# Altium footprint library ADP_Connector.PcbLib: 49 footprints (part 2 of 4)
Each footprint in its own frame and in the unit in brackets; x right, y up, seen from the top. Pads: shape width x height; smd on the part's side, far side on the other; paste and mask are expansions set on the pad; w line width, h text height; cw(c..) or ccw(c..) is an arc to the next point about the centre after c.
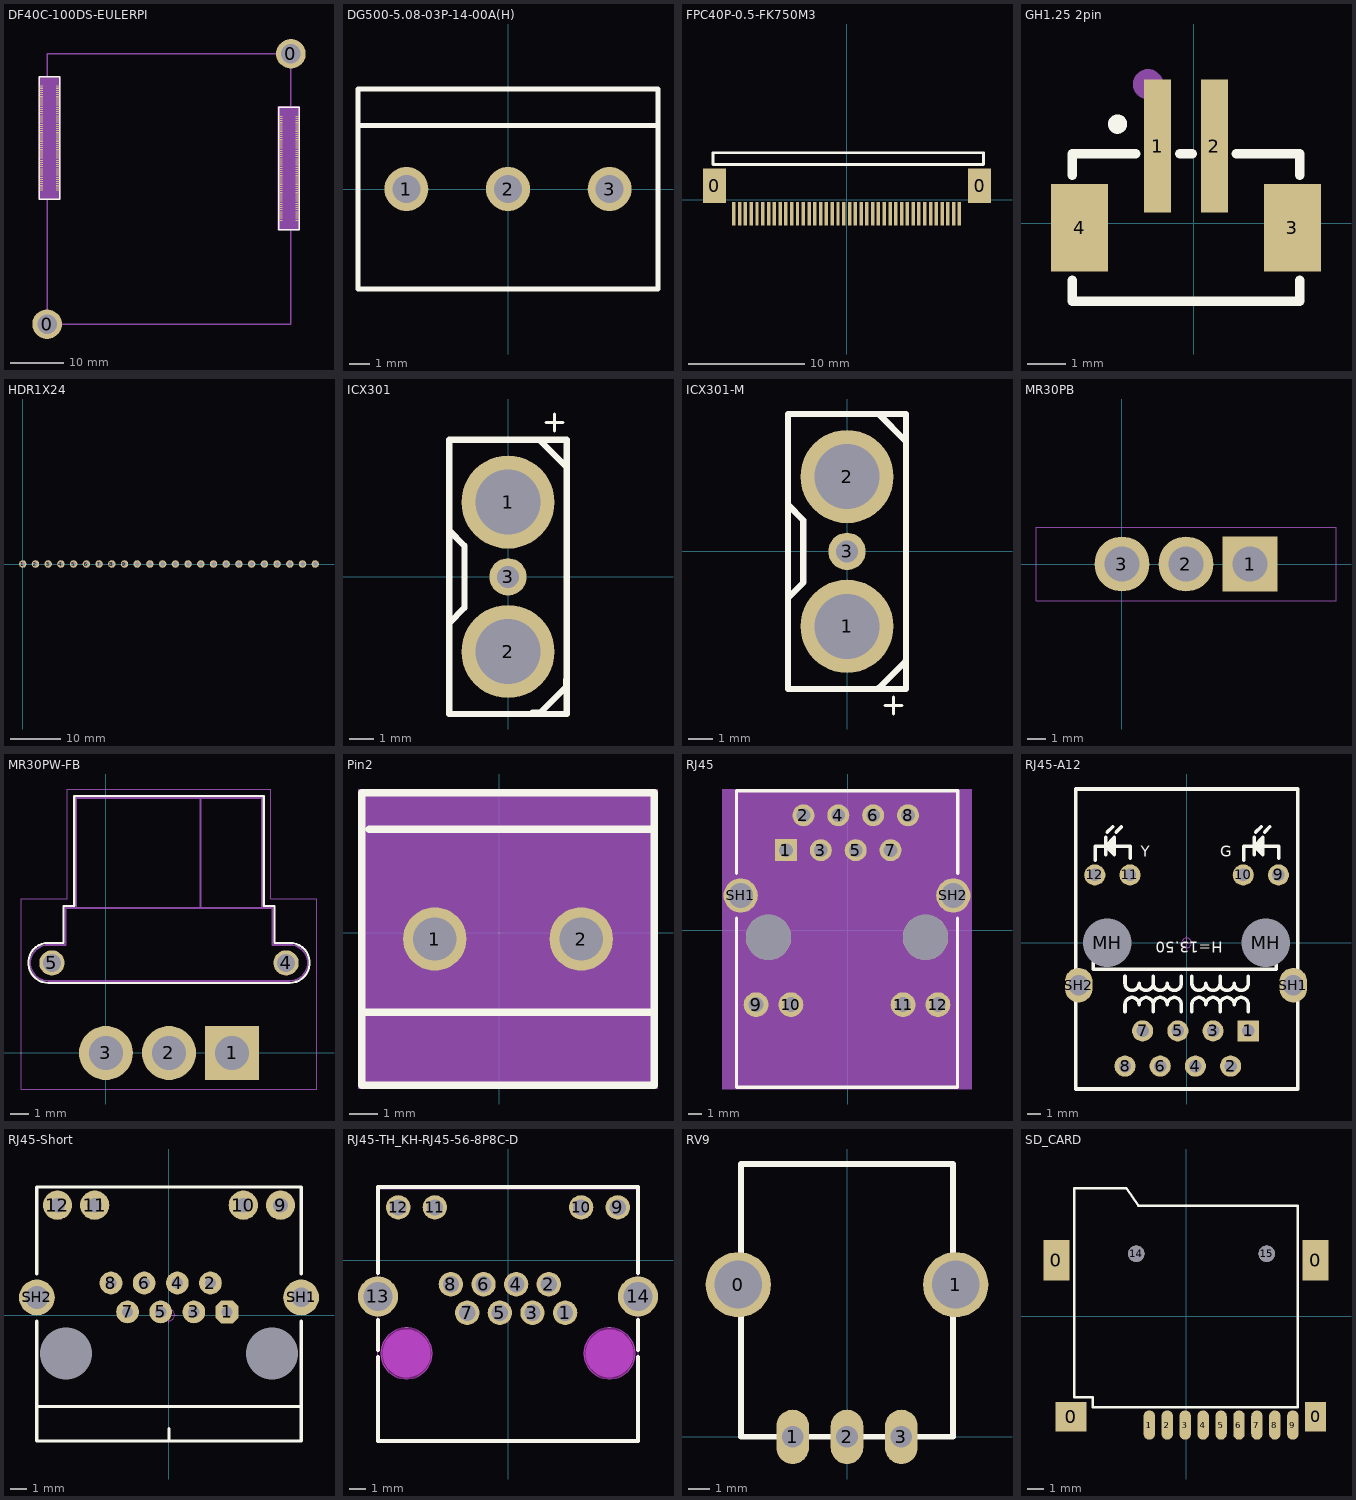
[diagram p1: the footprints below, top view; thin cyan lines are the x and y axes]

## DF40C-100DS-EULERPI [mil] "欧拉派核心板引脚"
pads (202):
  round 220.5 / inner round 220.5 / far side round 149.6 hole 145.7: 0(557.61,247.13) 0(2368.63,2255)
  rect 27.56x7.87 smd: A1(514.59,1243.57) A1R(2293.51,1018.57) A2(514.59,1259.32) A2R(2293.51,1034.32) A3(514.59,1275.07) A3R(2293.51,1050.07) A4(514.59,1290.82) A4R(2293.51,1065.82) A5(514.59,1306.57) A5R(2293.51,1081.57) A6(514.59,1322.31) A6R(2293.51,1097.31) A7(514.59,1338.06) A7R(2293.51,1113.06) A8(514.59,1353.81) A8R(2293.51,1128.81) A9(514.59,1369.56) A9R(2293.51,1144.56) A10(514.59,1385.31) A10R(2293.51,1160.31) A11(514.59,1401.05) A11R(2293.51,1176.05) A12(514.59,1416.8) A12R(2293.51,1191.8) A13(514.59,1432.55) A13R(2293.51,1207.55) A14(514.59,1448.3) A14R(2293.51,1223.3) A15(514.59,1464.05) A15R(2293.51,1239.05) A16(514.59,1479.79) A16R(2293.51,1254.79) A17(514.59,1495.54) A17R(2293.51,1270.54) A18(514.59,1511.29) A18R(2293.51,1286.29) A19(514.59,1527.04) A19R(2293.51,1302.04) A20(514.59,1542.79) A20R(2293.51,1317.79) A21(514.59,1558.53) A21R(2293.51,1333.53) A22(514.59,1574.28) A22R(2293.51,1349.28) A23(514.59,1590.03) A23R(2293.51,1365.03) A24(514.59,1605.78) A24R(2293.51,1380.78) A25(514.59,1621.53) A25R(2293.51,1396.53) A26(514.59,1637.27) A26R(2293.51,1412.27) A27(514.59,1653.02) A27R(2293.51,1428.02) A28(514.59,1668.77) A28R(2293.51,1443.77) A29(514.59,1684.52) A29R(2293.51,1459.52) A30(514.59,1700.27) A30R(2293.51,1475.27) A31(514.59,1716.01) A31R(2293.51,1491.01) A32(514.59,1731.76) A32R(2293.51,1506.76) A33(514.59,1747.51) A33R(2293.51,1522.51) A34(514.59,1763.26) A34R(2293.51,1538.26) A35(514.59,1779.01) A35R(2293.51,1554.01) A36(514.59,1794.75) A36R(2293.51,1569.75) A37(514.59,1810.5) A37R(2293.51,1585.5) A38(514.59,1826.25) A38R(2293.51,1601.25) A39(514.59,1842) A39R(2293.51,1617) A40(514.59,1857.75) A40R(2293.51,1632.75) A41(514.59,1873.49) A41R(2293.51,1648.49) A42(514.59,1889.24) A42R(2293.51,1664.24) A43(514.59,1904.99) A43R(2293.51,1679.99) A44(514.59,1920.74) A44R(2293.51,1695.74) A45(514.59,1936.49) A45R(2293.51,1711.49) A46(514.59,1952.23) A46R(2293.51,1727.23) A47(514.59,1967.98) A47R(2293.51,1742.98) A48(514.59,1983.73) A48R(2293.51,1758.73) A49(514.59,1999.48) A49R(2293.51,1774.48) A50(514.59,2015.23) A50R(2293.51,1790.23) B1(635.85,1243.57) B1R(2414.77,1018.57) B2(635.85,1259.32) B2R(2414.77,1034.32) B3(635.85,1275.07) B3R(2414.77,1050.07) B4(635.85,1290.82) B4R(2414.77,1065.82) B5(635.85,1306.57) B5R(2414.77,1081.57) B6(635.85,1322.31) B6R(2414.77,1097.31) B7(635.85,1338.06) B7R(2414.77,1113.06) B8(635.85,1353.81) B8R(2414.77,1128.81) B9(635.85,1369.56) B9R(2414.77,1144.56) B10(635.85,1385.31) B10R(2414.77,1160.31) B11(635.85,1401.05) B11R(2414.77,1176.05) B12(635.85,1416.8) B12R(2414.77,1191.8) B13(635.85,1432.55) B13R(2414.77,1207.55) B14(635.85,1448.3) B14R(2414.77,1223.3) B15(635.85,1464.05) B15R(2414.77,1239.05) B16(635.85,1479.79) B16R(2414.77,1254.79) B17(635.85,1495.54) B17R(2414.77,1270.54) B18(635.85,1511.29) B18R(2414.77,1286.29) B19(635.85,1527.04) B19R(2414.77,1302.04) B20(635.85,1542.79) B20R(2414.77,1317.79) B21(635.85,1558.53) B21R(2414.77,1333.53) B22(635.85,1574.28) B22R(2414.77,1349.28) B23(635.85,1590.03) B23R(2414.77,1365.03) B24(635.85,1605.78) B24R(2414.77,1380.78) B25(635.85,1621.53) B25R(2414.77,1396.53) B26(635.85,1637.27) B26R(2414.77,1412.27) B27(635.85,1653.02) B27R(2414.77,1428.02) B28(635.85,1668.77) B28R(2414.77,1443.77) B29(635.85,1684.52) B29R(2414.77,1459.52) B30(635.85,1700.27) B30R(2414.77,1475.27) B31(635.85,1716.01) B31R(2414.77,1491.01) B32(635.85,1731.76) B32R(2414.77,1506.76) B33(635.85,1747.51) B33R(2414.77,1522.51) B34(635.85,1763.26) B34R(2414.77,1538.26) B35(635.85,1779.01) B35R(2414.77,1554.01) B36(635.85,1794.75) B36R(2414.77,1569.75) B37(635.85,1810.5) B37R(2414.77,1585.5) B38(635.85,1826.25) B38R(2414.77,1601.25) B39(635.85,1842) B39R(2414.77,1617) B40(635.85,1857.75) B40R(2414.77,1632.75) B41(635.85,1873.49) B41R(2414.77,1648.49) B42(635.85,1889.24) B42R(2414.77,1664.24) B43(635.85,1904.99) B43R(2414.77,1679.99) B44(635.85,1920.74) B44R(2414.77,1695.74) B45(635.85,1936.49) B45R(2414.77,1711.49) B46(635.85,1952.23) B46R(2414.77,1727.23) B47(635.85,1967.98) B47R(2414.77,1742.98) B48(635.85,1983.73) B48R(2414.77,1758.73) B49(635.85,1999.48) B49R(2414.77,1774.48) B50(635.85,2015.23) B50R(2414.77,1790.23)
Top Overlay:
  lines w10: 498.84,1174.68 498.84,2084.12 651.6,2084.12 651.6,1174.68 498.84,1174.68 ; 2277.76,949.68 2430.52,949.68 2430.52,1859.12 2277.76,1859.12 2277.76,949.68
Mechanical 3:
  lines w10: 557.61,247.13 2368.63,247.13 2368.63,2255 557.61,2255 557.61,443.98 557.61,247.13
Top 3D Body:
  region: 656.6,1169.68 656.6,2089.12 493.84,2089.12 493.84,1169.68
  region: 2435.52,944.68 2435.52,1864.12 2272.76,1864.12 2272.76,944.68
Mechanical 25:
  text "1" at 487.45,247.13 h25.2
  text "1" at 2298.47,2255 h25.2
  text "B35" at 599.85,1779.01 h30
  text "A49" at 478.59,1999.48 h30
  text "B43" at 599.85,1904.99 h30
  text "A37" at 478.59,1810.5 h30
  text "A40" at 478.59,1857.75 h30
  text "A43" at 478.59,1904.99 h30
  text "A46" at 478.59,1952.23 h30
  text "B21" at 599.85,1558.53 h30
  text "B24" at 599.85,1605.78 h30
  text "A21" at 478.59,1558.53 h30
  text "A24" at 478.59,1605.78 h30
  text "B12" at 599.85,1416.8 h30
  text "B15" at 599.85,1464.05 h30
  text "B18" at 599.85,1511.29 h30
  text "B6" at 611.85,1322.31 h30
  text "B9" at 611.85,1369.56 h30
  text "A12" at 478.59,1416.8 h30
  text "A15" at 478.59,1464.05 h30
  text "A18" at 478.59,1511.29 h30
  text "A6" at 490.59,1322.31 h30
  text "A9" at 490.59,1369.56 h30
  text "B50" at 599.85,2015.23 h30
  text "A38" at 478.59,1826.25 h30
  text "A29" at 478.59,1684.52 h30
  text "A32" at 478.59,1731.76 h30
  text "B7" at 611.85,1338.06 h30
  text "B33" at 599.85,1747.51 h30
  text "A10" at 478.59,1385.31 h30
  text "A47" at 478.59,1967.98 h30
  text "A45" at 478.59,1936.49 h30
  text "B8" at 611.85,1353.81 h30
  text "B46" at 599.85,1952.23 h30
  text "B49" at 599.85,1999.48 h30
  text "A50" at 478.59,2015.23 h30
  text "A11" at 478.59,1401.05 h30
  text "B10" at 599.85,1385.31 h30
  text "B14" at 599.85,1448.3 h30
  text "B34" at 599.85,1763.26 h30
  text "A48" at 478.59,1983.73 h30
  text "A39" at 478.59,1842 h30
  text "B44" at 599.85,1920.74 h30
  text "B13" at 599.85,1432.55 h30
  text "B41" at 599.85,1873.49 h30
  text "B42" at 599.85,1889.24 h30
  text "A44" at 478.59,1920.74 h30
  text "B48" at 599.85,1983.73 h30
  text "A7" at 490.59,1338.06 h30
  text "B11" at 599.85,1401.05 h30
  text "A42" at 478.59,1889.24 h30
  text "B36" at 599.85,1794.75 h30
  text "B37" at 599.85,1810.5 h30
  text "B38" at 599.85,1826.25 h30
  text "A41" at 478.59,1873.49 h30
  text "B47" at 599.85,1967.98 h30
  text "A8" at 490.59,1353.81 h30
  text "A33" at 478.59,1747.51 h30
  text "A26" at 478.59,1637.27 h30
  text "A28" at 478.59,1668.77 h30
  text "A25" at 478.59,1621.53 h30
  text "A27" at 478.59,1653.02 h30
  text "B5" at 611.85,1306.57 h30
  text "A3" at 490.59,1275.07 h30
  text "A5" at 490.59,1306.57 h30
  text "B2" at 611.85,1259.32 h30
  text "A4" at 490.59,1290.82 h30
  text "A1" at 490.59,1243.57 h30
  text "A30" at 478.59,1700.27 h30
  text "A2" at 490.59,1259.32 h30
  text "B4" at 611.85,1290.82 h30
  text "B3" at 611.85,1275.07 h30
  text "B16" at 599.85,1479.79 h30
  text "B17" at 599.85,1495.54 h30
  text "B28" at 599.85,1668.77 h30
  text "B29" at 599.85,1684.52 h30
  text "B30" at 599.85,1700.27 h30
  text "B31" at 599.85,1716.01 h30
  text "B32" at 599.85,1731.76 h30
  text "B27" at 599.85,1653.02 h30
  text "B26" at 599.85,1637.27 h30
  text "B25" at 599.85,1621.53 h30
  text "B45" at 599.85,1936.49 h30
  text "A31" at 478.59,1716.01 h30
  text "B1" at 611.85,1243.57 h30
  text "B19" at 599.85,1527.04 h30
  text "B20" at 599.85,1542.79 h30
  text "B22" at 599.85,1574.28 h30
  text "A20" at 478.59,1542.79 h30
  text "A17" at 478.59,1495.54 h30
  text "B23" at 599.85,1590.03 h30
  text "A22" at 478.59,1574.28 h30
  text "A16" at 478.59,1479.79 h30
  text "A14" at 478.59,1448.3 h30
  text "A13" at 478.59,1432.55 h30
  text "A19" at 478.59,1527.04 h30
  text "A23" at 478.59,1590.03 h30
  text "B40" at 599.85,1857.75 h30
  text "B39" at 599.85,1842 h30
  text "A35" at 478.59,1779.01 h30
  text "A34" at 478.59,1763.26 h30
  text "A36" at 478.59,1794.75 h30
  text "B40" at 2378.77,1632.75 h30
  text "A39" at 2257.51,1617 h30
  text "A42" at 2257.51,1664.24 h30
  text "A45" at 2257.51,1711.49 h30
  text "B43" at 2378.77,1679.99 h30
  text "B46" at 2378.77,1727.23 h30
  text "A48" at 2257.51,1758.73 h30
  text "A12" at 2257.51,1191.8 h30
  text "A9" at 2269.51,1144.56 h30
  text "B14" at 2378.77,1223.3 h30
  text "B6" at 2390.77,1097.31 h30
  text "A3" at 2269.51,1050.07 h30
  text "B3" at 2390.77,1050.07 h30
  text "B9" at 2390.77,1144.56 h30
  text "B31" at 2378.77,1491.01 h30
  text "A6" at 2269.51,1097.31 h30
  text "A50" at 2257.51,1790.23 h30
  text "A49" at 2257.51,1774.48 h30
  text "B50" at 2378.77,1790.23 h30
  text "B49" at 2378.77,1774.48 h30
  text "B47" at 2378.77,1742.98 h30
  text "B48" at 2378.77,1758.73 h30
  text "A7" at 2269.51,1113.06 h30
  text "A10" at 2257.51,1160.31 h30
  text "A8" at 2269.51,1128.81 h30
  text "A11" at 2257.51,1176.05 h30
  text "B2" at 2390.77,1034.32 h30
  text "B1" at 2390.77,1018.57 h30
  text "A2" at 2269.51,1034.32 h30
  text "B7" at 2390.77,1113.06 h30
  text "A1" at 2269.51,1018.57 h30
  text "B8" at 2390.77,1128.81 h30
  text "A5" at 2269.51,1081.57 h30
  text "A4" at 2269.51,1065.82 h30
  text "B5" at 2390.77,1081.57 h30
  text "B4" at 2390.77,1065.82 h30
  text "B39" at 2378.77,1617 h30
  text "A31" at 2257.51,1491.01 h30
  text "B12" at 2378.77,1191.8 h30
  text "A29" at 2257.51,1459.52 h30
  text "B36" at 2378.77,1569.75 h30
  text "B35" at 2378.77,1554.01 h30
  text "B38" at 2378.77,1601.25 h30
  text "B37" at 2378.77,1585.5 h30
  text "B34" at 2378.77,1538.26 h30
  text "B33" at 2378.77,1522.51 h30
  text "B32" at 2378.77,1506.76 h30
  text "A30" at 2257.51,1475.27 h30
  text "A28" at 2257.51,1443.77 h30
  text "A27" at 2257.51,1428.02 h30
  text "A19" at 2257.51,1302.04 h30
  text "B25" at 2378.77,1396.53 h30
  text "B27" at 2378.77,1428.02 h30
  text "B30" at 2378.77,1475.27 h30
  text "B26" at 2378.77,1412.27 h30
  text "B29" at 2378.77,1459.52 h30
  text "B28" at 2378.77,1443.77 h30
  text "A22" at 2257.51,1349.28 h30
  text "A23" at 2257.51,1365.03 h30
  text "A24" at 2257.51,1380.78 h30
  text "A25" at 2257.51,1396.53 h30
  text "A26" at 2257.51,1412.27 h30
  text "B17" at 2378.77,1270.54 h30
  text "B22" at 2378.77,1349.28 h30
  text "B21" at 2378.77,1333.53 h30
  text "B20" at 2378.77,1317.79 h30
  text "A14" at 2257.51,1223.3 h30
  text "B18" at 2378.77,1286.29 h30
  text "A16" at 2257.51,1254.79 h30
  text "A21" at 2257.51,1333.53 h30
  text "B24" at 2378.77,1380.78 h30
  text "A18" at 2257.51,1286.29 h30
  text "A15" at 2257.51,1239.05 h30
  text "B19" at 2378.77,1302.04 h30
  text "A20" at 2257.51,1317.79 h30
  text "B23" at 2378.77,1365.03 h30
  text "B16" at 2378.77,1254.79 h30
  text "A17" at 2257.51,1270.54 h30
  text "B15" at 2378.77,1239.05 h30
  text "B42" at 2378.77,1664.24 h30
  text "B11" at 2378.77,1176.05 h30
  text "B44" at 2378.77,1695.74 h30
  text "B13" at 2378.77,1207.55 h30
  text "A41" at 2257.51,1648.49 h30
  text "A43" at 2257.51,1679.99 h30
  text "A32" at 2257.51,1506.76 h30
  text "B10" at 2378.77,1160.31 h30
  text "A37" at 2257.51,1585.5 h30
  text "A13" at 2257.51,1207.55 h30
  text "A38" at 2257.51,1601.25 h30
  text "A44" at 2257.51,1695.74 h30
  text "B45" at 2378.77,1711.49 h30
  text "A35" at 2257.51,1554.01 h30
  text "A47" at 2257.51,1742.98 h30
  text "B41" at 2378.77,1648.49 h30
  text "A46" at 2257.51,1727.23 h30
  text "A40" at 2257.51,1632.75 h30
  text "A36" at 2257.51,1569.75 h30
  text "A33" at 2257.51,1522.51 h30
  text "A34" at 2257.51,1538.26 h30
Mechanical 36:
  text "Recommended Metal Mask Thickness: t=0.12[mm]" at 375.22,1529.4 h11.81
  text "Recommended Metal Mask Thickness: t=0.12[mm]" at 2154.14,1304.4 h11.81
3D body: height 150, standoff 0, extent 493.84,1169.68 656.6,2089.12
3D body: height 150, standoff 0, extent 2272.76,944.68 2435.52,1864.12

## DG500-5.08-03P-14-00A(H) [mm]
pads (3):
  round 2.2 hole 1.4: 1(-5.08,0) 2(0,0) 3(5.08,0)
Top Overlay:
  lines w0.254: -7.493,3.175 7.366,3.175 ; -7.5,-5 -7.5,5 7.5,5 7.5,-5 -7.5,-5
Mechanical 15:
  lines w0.003: 0.266,0.364 0.317,0.415

## FPC40P-0.5-FK750M3 [mm]
pads (42):
  rect 2x3 smd: 0(-11.465,1.202) 0(11.465,1.202)
  rect 0.3x2 smd: 1(9.721,-1.202) 2(9.221,-1.202) 3(8.721,-1.202) 4(8.221,-1.202) 5(7.721,-1.202) 6(7.221,-1.202) 7(6.721,-1.202) 8(6.221,-1.202) 9(5.721,-1.202) 10(5.221,-1.202) 11(4.721,-1.202) 12(4.221,-1.202) 13(3.721,-1.202) 14(3.221,-1.202) 15(2.721,-1.202) 16(2.221,-1.202) 17(1.721,-1.202) 18(1.221,-1.202) 19(0.721,-1.202) 20(0.221,-1.202) 21(-0.279,-1.202) 22(-0.779,-1.202) 23(-1.279,-1.202) 24(-1.779,-1.202) 25(-2.279,-1.202) 26(-2.779,-1.202) 27(-3.279,-1.202) 28(-3.779,-1.202) 29(-4.279,-1.202) 30(-4.779,-1.202) 31(-5.279,-1.202) 32(-5.779,-1.202) 33(-6.279,-1.202) 34(-6.779,-1.202) 35(-7.279,-1.202) 36(-7.779,-1.202) 37(-8.279,-1.202) 38(-8.779,-1.202) 39(-9.279,-1.202) 40(-9.779,-1.202)
Top Overlay:
  lines w0.254: -11.585,3.049 -11.585,4.065 11.815,4.065 11.815,3.049 -11.585,3.049
3D body "User Library-FPC-40-2.STEP": height 1.95, standoff 0, extent -12.23,-1.755 12.17,4.545

## GH1.25 2pin [mm]
pads (4):
  rect 0.7x3.5 smd: 1(-0.955,2.034) 2(0.545,2.034)
  rect 1.5x2.3 smd: 3(2.595,-0.116) 4(-3.005,-0.116)
Top Overlay:
  circle w0.254: c-2.007,2.61 r0.127
  lines w0.254: -3.205,-1.497 -3.205,-2.054 2.795,-2.054 2.795,-1.497 ; -3.205,1.265 -3.205,1.834 -1.536,1.834 ; -0.374,1.834 -0.036,1.834 ; 1.126,1.834 2.794,1.834 2.794,1.265
Mechanical 15:
  circle w0.4: c-1.205,3.659 r0.2

## HDR1X24 [mm] "Connector; Header; 24 Position"
pads (24):
  round 1.5 hole 0.9: 1(0,0) 2(2.54,0) 3(5.08,0) 4(7.62,0) 5(10.16,0) 6(12.7,0) 7(15.24,0) 8(17.78,0) 9(20.32,0) 10(22.86,0) 11(25.4,0) 12(27.94,0) 13(30.48,0) 14(33.02,0) 15(35.56,0) 16(38.1,0) 17(40.64,0) 18(43.18,0) 19(45.72,0) 20(48.26,0) 21(50.8,0) 22(53.34,0) 23(55.88,0) 24(58.42,0)

## ICX301 [mm] "ICX301-F"
pads (3):
  round 3.8 hole 2.65: 1(0,3.05) 2(0,-3.05)
  round 1.524 hole 0.9: 3(0,0)
Top Overlay:
  lines w0.127: 1.545,6.3 2.245,6.3 ; 1.9,5.95 1.9,6.65
  lines w0.254: -2.4,-2.39 -2.4,-1.892 -1.778,-1.27 -1.778,1.27 -2.4,1.892 -2.4,2.416 ; 0,5.6 2.4,5.6 ; 1.003,-5.547 1.311,-5.547 2.37,-4.488 2.37,-4.204 ; 1.285,5.6 2.4,4.485 2.4,4.433 ; 2.4,5.6 2.4,-5.6 -2.4,-5.6 -2.4,5.6 2.4,5.6

## ICX301-M [mm]
pads (3):
  round 3.8 hole 2.65: 1(0,-3.05) 2(0,3.05)
  round 1.524 hole 0.9: 3(0,0)
Top Overlay:
  lines w0.127: 1.545,-6.273 2.245,-6.273 ; 1.9,-6.623 1.9,-5.923
  lines w0.254: -2.4,-2.39 -2.4,-1.892 -1.778,-1.27 -1.778,1.27 -2.4,1.892 -2.4,2.416 ; 0,5.6 2.4,5.6 ; 1.285,5.6 2.4,4.485 2.4,4.433 ; 1.311,-5.547 2.37,-4.488 ; 2.4,5.6 -2.4,5.6 -2.4,-5.6 2.4,-5.6 2.4,5.6

## MR30PB [mm]
pads (3):
  rect 3x3 hole 1.9 paste+0: 1(7,0)
  round 3 hole 1.9 paste+0: 2(3.5,0) 3(0,0)
Mechanical 6:
  lines w0.05: -4.7,-2 11.7,-2 11.7,2 -4.7,2 -4.7,-2

## MR30PW-FB [mm]
pads (5):
  rect 3x3 hole 1.9 paste+0: 1(7,0)
  round 3 hole 1.9 paste+0: 2(3.5,0) 3(0,0)
  round 1.4 hole 1 paste+0: 4(10,5) 5(-3,5)
Top Overlay:
  lines w0.12: -3.2,3.89 cw(c-3.2,5) -3.2,6.11 -2.36,6.11 -2.36,8.16 -1.76,8.16 -1.76,14.26 8.76,14.26 8.76,8.16 9.36,8.16 9.36,6.11 10.2,6.11 cw(c10.2,5) 10.2,3.89 -3.2,3.89
Mechanical 6:
  lines w0.05: -4.7,-2 -4.7,8.55 -2.15,8.55 -2.15,14.65 9.15,14.65 9.15,8.55 11.7,8.55 11.7,-2 -4.7,-2
Mechanical 15:
  lines w0.1: -2.25,6 -3.2,6 ccw(c-3.2,5) -3.2,4 10.2,4 ccw(c10.2,5) 10.2,6 9.255,6 ; -2.25,6.05 -2.25,8.05 9.25,8.05 9.25,6 ; -1.65,8.05 -1.65,14.15 8.65,14.15 8.65,8.05 ; 5.25,8.05 5.25,14.15

## Pin2 [mm]
pads (2):
  round 2.2 hole 1.5: 1(-2.244,-0.211) 2(2.836,-0.211)
Top Overlay:
  lines w0.254: -4.784,-2.751 5.376,-2.751 ; -4.53,3.599 5.376,3.599 ; -4.784,-5.291 -4.784,4.869 5.376,4.869 5.376,-5.291 -4.784,-5.291
Mechanical 4:
  region: -4.911,4.996 5.503,4.996 5.503,-5.418 -4.911,-5.418
Mechanical 5:
  region: -3.344,0.889 -1.144,0.889 -1.144,-1.311 -3.344,-1.311
  region: 1.736,0.889 3.936,0.889 3.936,-1.311 1.736,-1.311
Mechanical 15:
  lines w0.003: 0.059,0.218 0.11,0.269

## RJ45 [mm]
pads (16):
  rect 1.6x1.6 hole 1: 1(-4.496,5.84)
  round 1.6 hole 1: 2(-3.226,8.38) 3(-1.956,5.84) 4(-0.686,8.38) 5(0.584,5.84) 6(1.854,8.38) 7(3.124,5.84) 8(4.394,8.38)
  round 1.8 hole 1.1: 9(-6.676,-5.41) 10(-4.136,-5.41) 11(4.034,-5.41) 12(6.574,-5.41)
  round 2.5 hole 1.8: SH1(-7.796,2.54) SH2(7.694,2.54)
  round 3.3 hole 3.3 unplated: ""(-5.766,-0.51) ""(5.664,-0.51)
Top Overlay:
  lines w0.254: -8.101,0.87 -8.101,-11.43 7.999,-11.43 7.999,0.87 ; -8.101,4.17 -8.101,10.17 7.999,10.17 8,4.17
Mechanical 4:
  circle w1.65: c5.664,-0.51 r0.825
  circle w1.65: c-5.766,-0.51 r0.825
  region: -9.144,10.297 9.042,10.297 9.042,-11.557 -9.144,-11.557
Mechanical 5:
  circle w0.127: c5.664,-0.51 r1.65
  circle w0.127: c-5.766,-0.51 r1.65
  region: 6.444,3.79 8.944,3.79 8.944,1.29 6.444,1.29
  region: -9.046,3.79 -6.546,3.79 -6.546,1.29 -9.046,1.29
  region: 5.674,-4.51 7.474,-4.51 7.474,-6.31 5.674,-6.31
  region: 3.134,-4.51 4.934,-4.51 4.934,-6.31 3.134,-6.31
  region: -5.036,-4.51 -3.236,-4.51 -3.236,-6.31 -5.036,-6.31
  region: -7.576,-4.51 -5.776,-4.51 -5.776,-6.31 -7.576,-6.31
  region: 3.594,9.18 5.194,9.18 5.194,7.58 3.594,7.58
  region: 2.324,6.64 3.924,6.64 3.924,5.04 2.324,5.04
  region: 1.054,9.18 2.654,9.18 2.654,7.58 1.054,7.58
  region: -0.216,6.64 1.384,6.64 1.384,5.04 -0.216,5.04
  region: -1.486,9.18 0.114,9.18 0.114,7.58 -1.486,7.58
  region: -2.756,6.64 -1.156,6.64 -1.156,5.04 -2.756,5.04
  region: -4.026,9.18 -2.426,9.18 -2.426,7.58 -4.026,7.58
  region: -5.296,6.64 -3.696,6.64 -3.696,5.04 -5.296,5.04
Mechanical 15:
  lines w0.003: -0.076,0.215 -0.025,0.265

## RJ45-A12 [mil] "网线接口"
height 665.35
pads (16):
  rect 60x60 hole 35.43: 1(175,-250)
  round 60 hole 35.43: 2(125,-350) 3(75,-250) 4(25,-350) 5(-25,-250) 6(-75,-350) 7(-125,-250) 8(-175,-350) 9(260.83,192.91) 10(160.83,192.91) 11(-160.82,192.91) 12(-260.82,192.91)
  round 130 hole 137.8: MH(-225,0) MH(225,0)
  oval 78.74x98.43 hole 59.06: SH1(302.96,-120.08) SH2(-306.49,-120.08)
Top Overlay:
  lines w9.84: -260,234.8 -260,274.8 -160,274.8 -160,239.8 ; -230,249.8 -230,299.8 ; -225,314.8 -210,329.8 ; -213.92,259.34 -213.92,290.88 ; -200,314.8 -185,329.8 ; 161.65,234.8 161.65,274.8 261.65,274.8 261.65,239.8 ; 191.65,249.8 191.65,299.8 ; 196.65,314.8 211.65,329.8 ; 207.73,259.34 207.73,290.88 ; 221.65,314.8 236.65,329.8 ; -230,274.8 -205,249.8 -205,299.8 -230,274.8 ; 191.65,274.8 216.65,249.8 216.65,299.8 191.65,274.8
  lines w10: -265,-55 -265,-75 255,-75 255,-55 ; -175,-195 -175,-175 cw(c-155,-175) -135,-175 cw(c-115,-175) -95,-175 ; -175,-95 -175,-115 ccw(c-155,-115) -135,-115 ccw(c-115,-115) -95,-115 ; -95,-195 -95,-175 ; -95,-95 -95,-115 ; -15,-195 -15,-175 ccw(c-35,-175) -55,-175 ccw(c-75,-175) -95,-175 ; -15,-95 -15,-115 cw(c-35,-115) -55,-115 cw(c-75,-115) -95,-115 ; 15,-195 15,-175 cw(c35,-175) 55,-175 cw(c75,-175) 95,-175 ; 15,-95 15,-115 ccw(c35,-115) 55,-115 ccw(c75,-115) 95,-115 ; 95,-195 95,-175 ; 95,-95 95,-115 ; 175,-195 175,-175 ccw(c155,-175) 135,-175 ccw(c115,-175) 95,-175 ; 175,-95 175,-115 cw(c155,-115) 135,-115 cw(c115,-115) 95,-115 ; -315,-415 -315,437.01 315,437.01 315,-415 -315,-415
  text "H=13.50" at 101.94,3.75 h31.5
  text "Y" at -130,244.8 h31.5
  text "G" at 95,244.8 h31.5
Mechanical 15:
  circle w1.97: c0,0 r13.78
  lines w1.97: -19.69,0 19.68,0 ; 0,-19.68 0,19.69
3D body "HanRun-HR911105A.STEP": height 59.06, standoff -590.55, extent -311.37,-412.34 313.83,430.18

## RJ45-Short [mm] "RJ45屏蔽网络插座带LED"
height 16.9
pads (16):
  oct 1.4x1.4 hole 0.7: 1(3.57,0.19)
  round 1.4 hole 0.7: 2(2.55,1.97) 3(1.53,0.19) 4(0.51,1.97) 5(-0.51,0.19) 6(-1.53,1.97) 7(-2.55,0.19) 8(-3.57,1.97)
  round 0 hole 3.2 unplated: 9(-6.35,-2.363) 10(6.35,-2.363)
  round 1.8 hole 0.9 unplated: 9(6.86,6.757) 10(4.57,6.757) 11(-4.57,6.757) 12(-6.86,6.757)
  round 2.2 hole 1.2: SH1(8.128,1.08)
  round 2.2 hole 1.4: SH2(-8.128,1.08)
Top Overlay:
  lines w0.203: -8.128,-5.626 8.128,-5.626 ; -8.128,-0.381 -8.128,-7.747 8.128,-7.747 8.128,-0.381 ; 0,-7.747 0,-6.985 ; -8.128,2.54 -8.128,7.874 8.128,7.874 8.128,2.54 ; -8.128,2.54 -8.128,2.54 ; 8.128,2.54 8.128,2.54
Mechanical 15:
  circle w0.05: c0,0 r0.35
  lines w0.05: -0.5,0 0.5,0 ; 0,-0.5 0,0.5
3D body "RJ45-2LED.STEP": height 12.85, standoff -2.95, extent -7.95,-7.65 7.95,7.75

## RJ45-TH_KH-RJ45-56-8P8C-D [mil]
pads (14):
  round 60 hole 40.16: 1(140.55,-129.73) 2(100.4,-59.65) 3(60.24,-129.73) 4(20.08,-59.65) 5(-20.08,-129.73) 6(-60.23,-59.65) 7(-100.39,-129.73) 8(-140.55,-59.65)
  round 60 hole 40.16 copper offset -0.01,0.01: 9(270.09,129.72)
  round 60 hole 40.16 copper offset 0,0.01: 10(179.92,129.72) 11(-179.92,129.72) 12(-270.08,129.72)
  round 98.42 hole 70.87: 13(-320.08,-89.57) 14(320.08,-89.57)
Top Overlay:
  lines w10: -320,-238.13 -320,-445.19 320,-445.19 320,-238.13 ; -320,-221.31 -320,-147.8 ; -320,-31.33 -320,179.81 320,179.81 320,-31.33 ; 320,-221.31 320,-147.8
Keep-Out Layer:
  board cut-out: -187.01,-229.72 -187.01,-223.52 -189.43,-211.35 -194.18,-199.89 -201.07,-189.57 -209.84,-180.79 -220.16,-173.9 -231.62,-169.15 -243.79,-166.73 -256.2,-166.73 -268.37,-169.15 -279.84,-173.9 -290.15,-180.79 -298.93,-189.57 -305.82,-199.88 -310.57,-211.35 -312.99,-223.52 -312.99,-229.72 -312.99,-235.93 -310.57,-248.1 -305.82,-259.56 -298.93,-269.88 -290.16,-278.65 -279.84,-285.55 -268.37,-290.3 -256.2,-292.72 -243.8,-292.72 -231.63,-290.3 -220.16,-285.55 -209.84,-278.65 -201.07,-269.88 -194.18,-259.56 -189.43,-248.1 -187.01,-235.93 -187.01,-229.72
  board cut-out: 312.99,-229.72 312.99,-223.52 310.57,-211.35 305.82,-199.89 298.93,-189.57 290.16,-180.8 279.84,-173.9 268.37,-169.15 256.2,-166.73 243.8,-166.73 231.63,-169.15 220.16,-173.9 209.85,-180.79 201.07,-189.57 194.18,-199.89 189.43,-211.35 187.01,-223.52 187.01,-229.72 187.01,-235.93 189.43,-248.1 194.18,-259.56 201.07,-269.88 209.84,-278.65 220.16,-285.55 231.62,-290.3 243.79,-292.72 256.2,-292.72 268.37,-290.3 279.84,-285.55 290.15,-278.65 298.93,-269.88 305.82,-259.56 310.57,-248.1 312.99,-235.93 312.99,-229.72
Mechanical 1:
  circle w0.2: c-250,-229.72 r62.99
  circle w0.2: c250,-229.72 r62.99
Mechanical 6:
  circle w59.05: c-250,-229.72 r29.53
  circle w59.05: c250,-229.72 r29.53
Mechanical 15:
  drawing of 19 lines, arcs and shapes, not listed
Multi-Layer keep-out:
  region: -187.01,-229.72 -187.01,-223.52 -189.43,-211.35 -194.18,-199.89 -201.07,-189.57 -209.84,-180.79 -220.16,-173.9 -231.62,-169.15 -243.79,-166.73 -256.2,-166.73 -268.37,-169.15 -279.84,-173.9 -290.15,-180.79 -298.93,-189.57 -305.82,-199.88 -310.57,-211.35 -312.99,-223.52 -312.99,-229.72 -312.99,-235.93 -310.57,-248.1 -305.82,-259.56 -298.93,-269.88 -290.16,-278.65 -279.84,-285.55 -268.37,-290.3 -256.2,-292.72 -243.8,-292.72 -231.63,-290.3 -220.16,-285.55 -209.84,-278.65 -201.07,-269.88 -194.18,-259.56 -189.43,-248.1 -187.01,-235.93 -187.01,-229.72
  region: 312.99,-229.72 312.99,-223.52 310.57,-211.35 305.82,-199.89 298.93,-189.57 290.16,-180.8 279.84,-173.9 268.37,-169.15 256.2,-166.73 243.8,-166.73 231.63,-169.15 220.16,-173.9 209.85,-180.79 201.07,-189.57 194.18,-199.89 189.43,-211.35 187.01,-223.52 187.01,-229.72 187.01,-235.93 189.43,-248.1 194.18,-259.56 201.07,-269.88 209.84,-278.65 220.16,-285.55 231.62,-290.3 243.79,-292.72 256.2,-292.72 268.37,-290.3 279.84,-285.55 290.15,-278.65 298.93,-269.88 305.82,-259.56 310.57,-248.1 312.99,-235.93 312.99,-229.72

## RV9 [mm]
pads (5):
  round 3 hole 2.2: 0(-5,7) 1(5,7)
  oval 1.5x2.5 hole 1: 1(-2.5,0) 2(0,0) 3(2.5,0)
Top Overlay:
  lines w0.254: -4.876,0 -4.876,12.55 4.876,12.55 4.876,0 -4.876,0
3D body "User Library-RV09ACF-40_RK09K1130A5R.step": height 20, standoff -3.8, extent -4.876,0 4.876,12.55

## SD_CARD [mm]
pads (15):
  rect 1.6x2.5 smd: 0(-7.953,3.429) 0(7.947,3.429)
  rect 1.9x1.8 smd: 0(-7.053,-6.171)
  rect 1.3x1.8 smd: 0(7.947,-6.171)
  oval 0.7x1.8 smd: 1(-2.253,-6.671) 2(-1.153,-6.671) 3(-0.053,-6.671) 4(1.047,-6.671) 5(2.147,-6.671) 6(3.247,-6.671) 7(4.347,-6.671) 8(5.447,-6.671) 9(6.547,-6.671)
  round 1 hole 1: 14(-3.053,3.829) 15(4.947,3.829)
Top Overlay:
  lines w0.152: -6.858,-4.953 -5.715,-4.953 -5.715,-5.588 -5.08,-5.588 6.401,-5.588 6.858,-5.588 6.858,6.782 -2.921,6.782 -3.658,7.849 -6.858,7.849 -6.858,-4.572 -6.858,-4.953
3D body "SDcard.STEP": height 2.05, standoff -0.4, extent -8,-7.4 8,7.85